# Altium footprint library cool_library.PcbLib: 1182 footprints (part 61 of 75)
Each footprint in its own frame and in the unit in brackets; x right, y up, seen from the top. Pads: shape width x height; smd on the part's side, far side on the other; paste and mask are expansions set on the pad; w line width, h text height; cw(c..) or ccw(c..) is an arc to the next point about the centre after c.
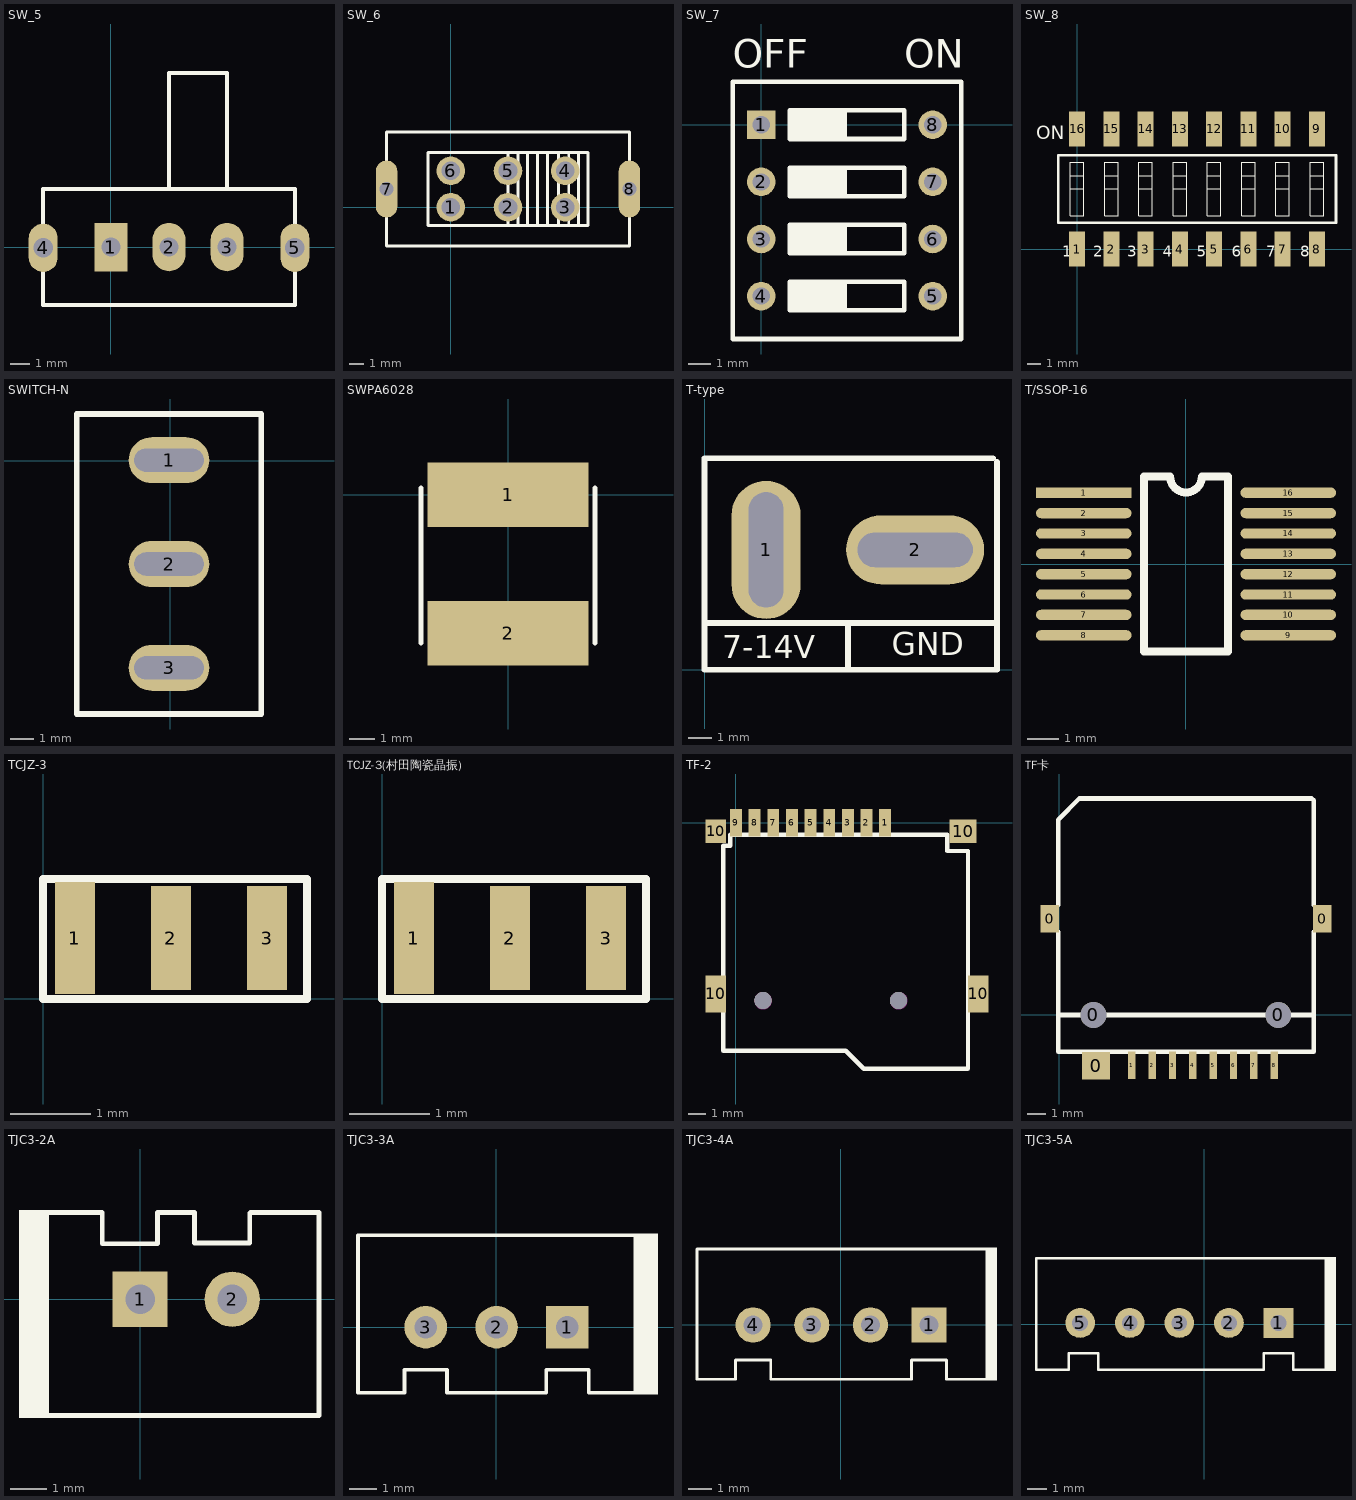
[diagram p60: the footprints below, top view; thin cyan lines are the x and y axes]

## SW_5 [mm]
pads (5):
  rect 1.7x2.5 hole 1: 1(0,0)
  oval 1.7x2.5 hole 1: 2(3,0) 3(6,0)
  oval 1.5x2.5 hole 1: 4(-3.5,-0.04) 5(9.5,-0.04)
Top Overlay:
  lines w0.203: 3,3 3,9 6,9 6,3 ; -3.5,-3 -3.5,3 9.5,3 9.5,-3 -3.5,-3

## SW_6 [mm]
pads (8):
  round 2 hole 1.3: 1(0,0) 2(4,0) 3(8,0) 4(8,2.54) 5(4,2.54) 6(0,2.54)
  oval 1.5x4 hole 1: 7(-4.5,1.27) 8(12.5,1.27)
Top Overlay:
  lines w0.203: 4.009,-1.282 4.009,3.822 ; 4.695,-1.282 4.695,3.822 ; 5.355,-1.282 5.355,3.822 ; 6.066,-1.282 6.066,3.822 ; 6.778,-1.282 6.778,3.822 ; 7.54,-1.282 7.54,3.822 ; 8.251,-1.282 8.251,3.822 ; 8.937,-1.282 8.937,3.822 ; -4.5,-2.73 -4.5,5.27 12.5,5.27 12.5,-2.73 -4.5,-2.73 ; -1.604,-1.282 9.604,-1.282 9.604,3.822 -1.604,3.822 -1.604,-1.282

## SW_7 [mil]
pads (8):
  rect 50x50 hole 30: 1(0,0)
  round 50 hole 30: 2(0,-100) 3(0,-200) 4(0,-300) 5(300,-300) 6(300,-200) 7(300,-100) 8(300,0)
Top Overlay:
  rectangle: 50,-325 150,-275
  rectangle: 50,-225 150,-175
  rectangle: 50,-125 150,-75
  rectangle: 50,-25 150,25
  lines w8: 50,-325 50,-275 ; 50,-325 50,-275 ; 50,-325 250,-325 250,-275 50,-275 ; 50,-225 50,-175 ; 50,-225 50,-175 ; 50,-225 250,-225 250,-175 50,-175 ; 50,-125 50,-75 ; 50,-125 50,-75 ; 50,-125 250,-125 250,-75 50,-75 ; 50,-25 50,25 ; 50,-25 50,25 ; 50,-25 250,-25 250,25 50,25 ; -50,-375 -50,75 350,75 350,-375 -50,-375
  text "OFF" at -50,100 h50
  text "ON" at 250,100 h50

## SW_8 [mm]
pads (16):
  rect 1.2x2.6 smd: 1(0,0) 2(2.54,0) 3(5.08,0) 4(7.62,0) 5(10.16,0) 6(12.7,0) 7(15.24,0) 8(17.78,0) 9(17.78,8.9) 10(15.24,8.9) 11(12.7,8.9) 12(10.16,8.9) 13(7.62,8.9) 14(5.08,8.9) 15(2.54,8.9) 16(0,8.9)
Top Overlay:
  lines w0.025: -0.5,4.45 0.5,4.45 ; -0.5,5.45 0.5,5.45 ; 2.04,4.45 3.04,4.45 ; 2.04,5.45 3.04,5.45 ; 4.58,4.45 5.58,4.45 ; 4.58,5.45 5.58,5.45 ; 7.12,4.45 8.12,4.45 ; 7.12,5.45 8.12,5.45 ; 9.66,4.45 10.66,4.45 ; 9.66,5.45 10.66,5.45 ; 12.2,4.45 13.2,4.45 ; 12.2,5.45 13.2,5.45 ; 14.74,4.45 15.74,4.45 ; 14.74,5.45 15.74,5.45 ; 17.28,4.45 18.28,4.45 ; 17.28,5.45 18.28,5.45 ; -0.5,2.45 0.5,2.45 0.5,6.45 -0.5,6.45 -0.5,2.45 ; 2.04,2.45 3.04,2.45 3.04,6.45 2.04,6.45 2.04,2.45 ; 4.58,2.45 5.58,2.45 5.58,6.45 4.58,6.45 4.58,2.45 ; 7.12,2.45 8.12,2.45 8.12,6.45 7.12,6.45 7.12,2.45 ; 9.66,2.45 10.66,2.45 10.66,6.45 9.66,6.45 9.66,2.45 ; 12.2,2.45 13.2,2.45 13.2,6.45 12.2,6.45 12.2,2.45 ; 14.74,2.45 15.74,2.45 15.74,6.45 14.74,6.45 14.74,2.45 ; 17.28,2.45 18.28,2.45 18.28,6.45 17.28,6.45 17.28,2.45
  lines w0.2: -1.4,1.95 19.2,1.95 19.2,6.95 -1.4,6.95 -1.4,1.95
  text "8" at 16.549,-0.582 h0.8
  text "7" at 14.009,-0.582 h0.8
  text "ON" at -3.048,8.128 h1
  text "1" at -1.116,-0.582 h0.8
  text "2" at 1.209,-0.582 h0.8
  text "3" at 3.709,-0.582 h0.8
  text "4" at 6.334,-0.582 h0.8
  text "5" at 8.859,-0.582 h0.8
  text "6" at 11.459,-0.582 h0.8

## SWITCH-N [mm]
pads (3):
  oval 3.5x2 hole 1 slot 3 at 0 deg: 1(-0.064,0.032) 2(-0.064,-4.468) 3(-0.064,-8.968)
Top Overlay:
  lines w0.254: -4.064,-10.968 -4.064,2.032 3.936,2.032 3.936,-10.968 -4.064,-10.968

## SWPA6028 [mil]
height 324
pads (2):
  rect 250x100 smd: 1(0,0) 2(0,-215)
Top Overlay:
  lines w7.99: -135,-230 -135,10 ; 135,-230 135,10

## T-type [mm]
pads (2):
  oval 3x6 hole 1.5 slot 5 at 90 deg: 1(2.667,5.207)
  oval 6x3 hole 1.5 slot 5 at 0 deg: 2(9.144,5.207)
Top Overlay:
  lines w0.254: 0.127,2.032 12.573,2.032 ; 6.223,0 6.223,2.032 ; 12.531,9.186 0,9.186 0,0 12.7,0 12.7,2.159 12.7,9.017
  text "GND" at 8.128,0.635 h1
  text "7-14V" at 0.762,0.508 h1

## T/SSOP-16 [mm]
height 15
pads (16):
  rect 3.048x0.33 smd: 1(-3.265,2.275)
  oval 3.048x0.33 smd: 2(-3.265,1.625) 3(-3.265,0.975) 4(-3.265,0.325) 5(-3.265,-0.325) 6(-3.265,-0.975) 7(-3.265,-1.625) 8(-3.265,-2.275) 9(3.265,-2.275) 10(3.265,-1.625) 11(3.265,-0.975) 12(3.265,-0.325) 13(3.265,0.325) 14(3.265,0.975) 15(3.265,1.625) 16(3.265,2.275)
Top Overlay:
  lines w0.254: -1.346,-2.794 -1.346,2.794 -0.508,2.794 ccw(c0,2.794) 0.508,2.794 1.346,2.794 1.346,-2.794 -1.346,-2.794

## TCJZ-3 [mm]
pads (3):
  rect 0.5x1.4 smd: 1(0.4,0.762)
  rect 0.5x1.3 smd: 2(1.6,0.762) 3(2.8,0.762)
Top Overlay:
  lines w0.1: 0,0 0,1.5 3.3,1.5 3.3,0 0,0

## TCJZ-3(村田陶瓷晶振) [mm]
pads (3):
  rect 0.5x1.4 smd: 1(0.4,0.762)
  rect 0.5x1.3 smd: 2(1.6,0.762) 3(2.8,0.762)
Top Overlay:
  lines w0.1: 0,0 3.3,0 3.3,1.5 0,1.5 0,0

## TF-2 [mm]
pads (13):
  rect 0.7x1.6 smd: 1(8.8,0) 2(7.7,0) 3(6.6,0) 4(5.5,0) 5(4.4,0) 6(3.3,0) 7(2.2,0) 8(1.1,0) 9(0,0)
  rect 1.2x2.2 smd: 10(-1.2,-10.1) 10(14.3,-10.1)
  rect 1.2x1.4 smd: 10(-1.2,-0.5)
  rect 1.6x1.4 smd: 10(13.4,-0.5)
via 9.6,-10.5 diameter 1 hole 1
via 1.6,-10.5 diameter 1 hole 1
Top Overlay:
  lines w0.254: 13.68,-14.52 7.538,-14.52 6.471,-13.453 -0.743,-13.453 -0.743,-1.362 -0.336,-1.362 -0.336,-0.702 12.465,-0.702 12.465,-1.667 13.684,-1.667 13.684,-14.5
Keep-Out Layer:
  circle w0.254: c9.6,-10.5 r0.4
  circle w0.254: c1.6,-10.5 r0.4
3D body: height 0.25, standoff 0, extent -0.787,-13.386 13.716,-0.711

## TF卡 [mm]
pads (13):
  rect 1x1.5 smd: 0(-0.508,5.207) 0(14.224,5.207)
  round 1.4 hole 1.4: 0(1.85,0) 0(11.85,0)
  rect 1.5x1.5 smd: 0(1.991,-2.745)
  rect 0.4x1.5 smd: 1(3.929,-2.718) 2(5.029,-2.718) 3(6.129,-2.718) 4(7.229,-2.718) 5(8.329,-2.718) 6(9.429,-2.718) 7(10.529,-2.718) 8(11.629,-2.718)
Top Overlay:
  lines w0.254: -0.051,4.5 -0.051,-2 13.767,-2 13.767,4.5 ; -0.051,5.944 -0.051,9.444 -0.051,10.566 1.092,11.709 13.665,11.709 13.767,11.608 13.767,8.814 ; 0,0 13.7,0 ; 13.767,5.944 13.767,9.444

## TJC3-2A [mil]
pads (2):
  rect 60x60 hole 32: 1(0,0)
  round 60 hole 32: 2(100,0)
Top Overlay:
  region: -98.84,96.5 -131.17,96.5 -131.17,-128.5 -98.84,-128.5
  lines w5: -105,-126 194,-126 194,94 119.48,94 ; -104,94 -87,94 -41,94 -41,60 19,60 19,94 59,94 59,61 119,61 119,93.52

## TJC3-3A [mil]
pads (3):
  rect 60x60 hole 32: 1(100.17,0)
  round 60 hole 32: 2(0.17,0) 3(-99.83,0)
Top Overlay:
  rectangle: 195.84,-95.1 228.17,132.4
  lines w5: -195.5,-92.52 -195.5,129.92 195.84,129.92 195.84,-92.52 130.17,-92.52 130.17,-60 70.17,-60 70.17,-92.52 -69.83,-92.52 -69.83,-60 -129.83,-60 -129.83,-92.52 -195.5,-92.52

## TJC3-4A [mil]
pads (4):
  rect 60x60 hole 32: 1(150.28,0)
  round 60 hole 32: 2(50.27,0) 3(-49.73,0) 4(-149.72,0)
Top Overlay:
  rectangle: 246,-95 266,132.5
  lines w5: 245.94,-92.52 180.28,-92.52 180.28,-60 120.28,-60 120.28,-92.52 -119.72,-92.52 -119.72,-60 -179.72,-60 -179.72,-92.52 -245.4,-92.52 -245.4,129.92 245.94,129.92

## TJC3-5A [mil]
pads (5):
  rect 60x60 hole 32: 1(149.5,2.5)
  round 60 hole 32: 2(49.5,2.5) 3(-50.5,2.5) 4(-150.5,2.5) 5(-250.5,2.5)
Top Overlay:
  rectangle: 245.17,-94 265.5,134.9
  lines w5: -214,-91.5 -214,-58.98 -273.5,-58.98 -273.5,-91.5 -339.17,-91.5 -339.17,132.09 -339.5,132.42 -246.17,132.42 245.17,132.42 245.17,-90.02 ; -213,-91.5 -120.5,-91.5 119.5,-91.5 ; 119.5,-90.02 119.5,-58.98 179.5,-58.98 179.5,-91.5 245.17,-91.5